# Altium schematic symbol library Capacitor - Ceramic - Sumsung.SchLib: 1421 symbols (part 2 of 8) (continued)
## CL05C100JB51PNC
designator C?, comment 10pF
CAP CER 10PF 50V NP0 0402; Part Number: CL05C100JB51PNC; Manufacturer: Samsung Electro-Mechanics America, Inc.; TemperatureRange: -55C ~ 125C; TemperatureCoefficient: C0G, NP0; Tolerance: 5%; Value: 10pF; PartId: 12579; Supplier 1: Digi-Key; Supplier Part Number 1: 1276-1626-2-ND; ComponentLink1Description: Datasheet; ComponentLink1URL: http://www.samsungsem.com/kr/support/library/product-catalog/__icsFiles/afieldfile/2015/11/18/MLCC.pdf; ComponentLink2Description: Digi-Key Listing; ComponentLink2URL: https://www.digikey.com/product-detail/en/samsung-electro-mechanics-america-inc/CL05C100JB51PNC/1276-1626-2-ND/3887284; Voltage: 50V; Price: 0.0052; Device Package: 0402 (1005 Metric)
footprint CAP 0402/1005
pins: 1, 2

## CL05C101FB5NNNC
designator C?, comment 100pF
CAP CER 100PF 50V NP0 0402; Part Number: CL05C101FB5NNNC; Manufacturer: Samsung Electro-Mechanics America, Inc.; TemperatureRange: -55C ~ 125C; TemperatureCoefficient: C0G, NP0; Tolerance: 1%; Value: 100pF; PartId: 12826; Supplier 1: Digi-Key; Supplier Part Number 1: 1276-1628-2-ND; ComponentLink1Description: Datasheet; ComponentLink1URL: http://www.samsungsem.com/kr/support/library/product-catalog/__icsFiles/afieldfile/2015/11/18/MLCC.pdf; ComponentLink2Description: Digi-Key Listing; ComponentLink2URL: https://www.digikey.com/product-detail/en/samsung-electro-mechanics-america-inc/CL05C101FB5NNNC/1276-1628-2-ND/3887286; Voltage: 50V; Price: 0.0112; Device Package: 0402 (1005 Metric)
footprint CAP 0402/1005
pins: 1, 2

## CL05C101JC51PNC
designator C?, comment 100pF
CAP CER 100PF 100V NP0 0402; Part Number: CL05C101JC51PNC; Manufacturer: Samsung Electro-Mechanics America, Inc.; TemperatureRange: -55C ~ 125C; TemperatureCoefficient: C0G, NP0; Tolerance: 5%; Value: 100pF; PartId: 12798; Supplier 1: Digi-Key; Supplier Part Number 1: 1276-1632-2-ND; ComponentLink1Description: Datasheet; ComponentLink1URL: http://www.samsungsem.com/kr/support/library/product-catalog/__icsFiles/afieldfile/2015/11/18/MLCC.pdf; ComponentLink2Description: Digi-Key Listing; ComponentLink2URL: https://www.digikey.com/product-detail/en/samsung-electro-mechanics-america-inc/CL05C101JC51PNC/1276-1632-2-ND/3887290; Voltage: 100V; Price: 0.0108; Device Package: 0402 (1005 Metric)
footprint CAP 0402/1005
pins: 1, 2

## CL05C102JA5NNNC
designator C?, comment 1000pF
CAP CER 1000PF 25V NP0 0402; Part Number: CL05C102JA5NNNC; Manufacturer: Samsung Electro-Mechanics America, Inc.; TemperatureRange: -55C ~ 125C; TemperatureCoefficient: C0G, NP0; Tolerance: 5%; Value: 1000pF; PartId: 12495; Supplier 1: Digi-Key; Supplier Part Number 1: 1276-1634-2-ND; ComponentLink1Description: Datasheet; ComponentLink1URL: http://www.samsungsem.com/kr/support/product-search/mlcc/CL05C102JA5NNNC.jsp; ComponentLink2Description: Digi-Key Listing; ComponentLink2URL: https://www.digikey.com/product-detail/en/samsung-electro-mechanics-america-inc/CL05C102JA5NNNC/1276-1634-2-ND/3887292; Voltage: 25V; Price: 0.0105; Device Package: 0402 (1005 Metric)
footprint CAP 0402/1005
pins: 1, 2

## CL05C102JO5NNNC
designator C?, comment 1000pF
CAP CER 1000PF 16V NP0 0402; Part Number: CL05C102JO5NNNC; Manufacturer: Samsung Electro-Mechanics America, Inc.; TemperatureRange: -55C ~ 125C; TemperatureCoefficient: C0G, NP0; Tolerance: 5%; Value: 1000pF; PartId: 12920; Supplier 1: Digi-Key; Supplier Part Number 1: 1276-1636-2-ND; ComponentLink1Description: Datasheet; ComponentLink1URL: http://www.samsungsem.com/kr/support/product-search/mlcc/CL05C102JO5NNNC.jsp; ComponentLink2Description: Digi-Key Listing; ComponentLink2URL: https://www.digikey.com/product-detail/en/samsung-electro-mechanics-america-inc/CL05C102JO5NNNC/1276-1636-2-ND/3887294; Voltage: 16V; Price: 0.0105; Device Package: 0402 (1005 Metric)
footprint CAP 0402/1005
pins: 1, 2

## CL05C120JB5NNNC
designator C?, comment 12pF
CAP CER 12PF 50V NP0 0402; Part Number: CL05C120JB5NNNC; Manufacturer: Samsung Electro-Mechanics America, Inc.; TemperatureRange: -55C ~ 125C; TemperatureCoefficient: C0G, NP0; Tolerance: 5%; Value: 12pF; PartId: 12384; Supplier 1: Digi-Key; Supplier Part Number 1: 1276-1178-2-ND; ComponentLink1Description: Datasheet; ComponentLink1URL: http://www.samsungsem.com/kr/support/product-search/mlcc/CL05C120JB5NNNC.jsp; ComponentLink2Description: Digi-Key Listing; ComponentLink2URL: https://www.digikey.com/product-detail/en/samsung-electro-mechanics-america-inc/CL05C120JB5NNNC/1276-1178-2-ND/3886836; Voltage: 50V; Price: 0.0022; Device Package: 0402 (1005 Metric)
footprint CAP 0402/1005
pins: 1, 2

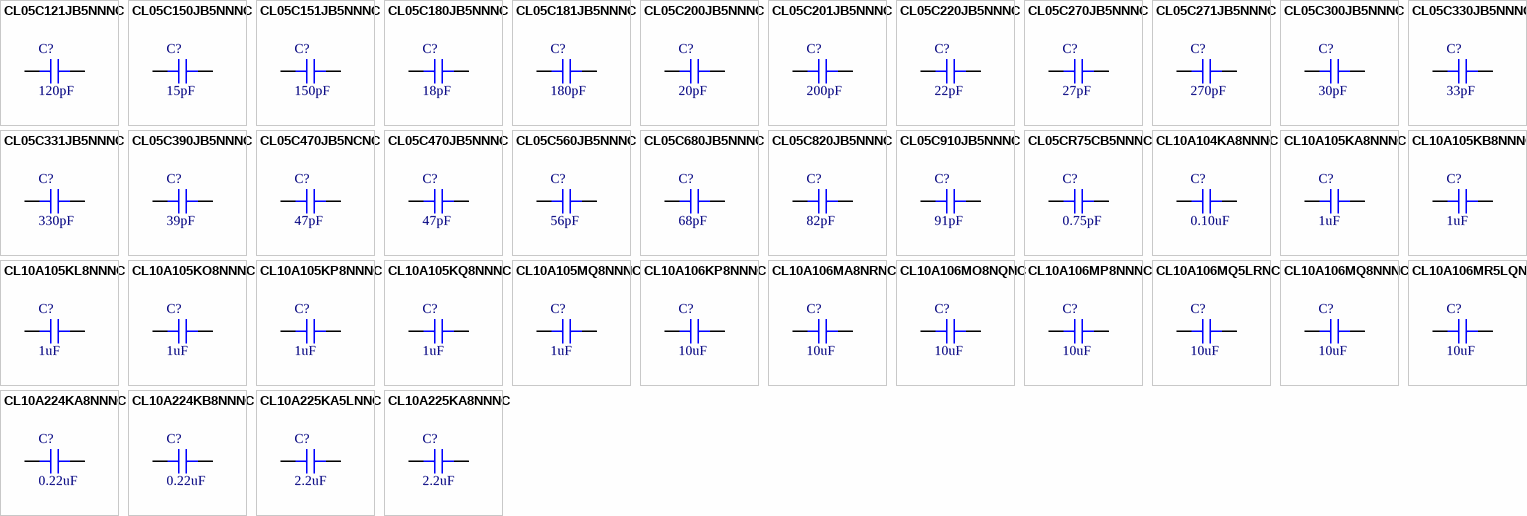
[diagram p6: symbols CL05C121JB5NNNC to CL10A225KA8NNNC]

## CL05C121JB5NNNC
designator C?, comment 120pF
CAP CER 120PF 50V NP0 0402; Part Number: CL05C121JB5NNNC; Manufacturer: Samsung Electro-Mechanics America, Inc.; TemperatureRange: -55C ~ 125C; TemperatureCoefficient: C0G, NP0; Tolerance: 5%; Value: 120pF; PartId: 12568; Supplier 1: Digi-Key; Supplier Part Number 1: 1276-1640-2-ND; ComponentLink1Description: Datasheet; ComponentLink1URL: http://www.samsungsem.com/kr/support/product-search/mlcc/CL05C121JB5NNNC.jsp; ComponentLink2Description: Digi-Key Listing; ComponentLink2URL: https://www.digikey.com/product-detail/en/samsung-electro-mechanics-america-inc/CL05C121JB5NNNC/1276-1640-2-ND/3887298; Voltage: 50V; Price: 0.0035; Device Package: 0402 (1005 Metric)
footprint CAP 0402/1005
pins: 1, 2

## CL05C150JB5NNNC
designator C?, comment 15pF
CAP CER 15PF 50V NP0 0402; Part Number: CL05C150JB5NNNC; Manufacturer: Samsung Electro-Mechanics America, Inc.; TemperatureRange: -55C ~ 125C; TemperatureCoefficient: C0G, NP0; Tolerance: 5%; Value: 15pF; PartId: 12620; Supplier 1: Digi-Key; Supplier Part Number 1: 1276-1179-2-ND; ComponentLink1Description: Datasheet; ComponentLink1URL: http://www.samsungsem.com/kr/support/product-search/mlcc/CL05C150JB5NNNC.jsp; ComponentLink2Description: Digi-Key Listing; ComponentLink2URL: https://www.digikey.com/product-detail/en/samsung-electro-mechanics-america-inc/CL05C150JB5NNNC/1276-1179-2-ND/3886837; Voltage: 50V; Price: 0.0022; Device Package: 0402 (1005 Metric)
footprint CAP 0402/1005
pins: 1, 2

## CL05C151JB5NNNC
designator C?, comment 150pF
CAP CER 150PF 50V NP0 0402; Part Number: CL05C151JB5NNNC; Manufacturer: Samsung Electro-Mechanics America, Inc.; TemperatureRange: -55C ~ 125C; TemperatureCoefficient: C0G, NP0; Tolerance: 5%; Value: 150pF; PartId: 12569; Supplier 1: Digi-Key; Supplier Part Number 1: 1276-1046-2-ND; ComponentLink1Description: Datasheet; ComponentLink1URL: http://www.samsungsem.com/kr/support/product-search/mlcc/CL05C151JB5NNNC.jsp; ComponentLink2Description: Digi-Key Listing; ComponentLink2URL: https://www.digikey.com/product-detail/en/samsung-electro-mechanics-america-inc/CL05C151JB5NNNC/1276-1046-2-ND/3886704; Voltage: 50V; Price: 0.0035; Device Package: 0402 (1005 Metric)
footprint CAP 0402/1005
pins: 1, 2

## CL05C180JB5NNNC
designator C?, comment 18pF
CAP CER 18PF 50V NP0 0402; Part Number: CL05C180JB5NNNC; Manufacturer: Samsung Electro-Mechanics America, Inc.; TemperatureRange: -55C ~ 125C; TemperatureCoefficient: C0G, NP0; Tolerance: 5%; Value: 18pF; PartId: 12459; Supplier 1: Digi-Key; Supplier Part Number 1: 1276-1140-2-ND; ComponentLink1Description: Datasheet; ComponentLink1URL: http://www.samsungsem.com/kr/support/product-search/mlcc/CL05C180JB5NNNC.jsp; ComponentLink2Description: Digi-Key Listing; ComponentLink2URL: https://www.digikey.com/product-detail/en/samsung-electro-mechanics-america-inc/CL05C180JB5NNNC/1276-1140-2-ND/3886798; Voltage: 50V; Price: 0.0022; Device Package: 0402 (1005 Metric)
footprint CAP 0402/1005
pins: 1, 2

## CL05C181JB5NNNC
designator C?, comment 180pF
CAP CER 180PF 50V NP0 0402; Part Number: CL05C181JB5NNNC; Manufacturer: Samsung Electro-Mechanics America, Inc.; TemperatureRange: -55C ~ 125C; TemperatureCoefficient: C0G, NP0; Tolerance: 5%; Value: 180pF; PartId: 12938; Supplier 1: Digi-Key; Supplier Part Number 1: 1276-1651-2-ND; ComponentLink1Description: Datasheet; ComponentLink1URL: http://www.samsungsem.com/kr/support/product-search/mlcc/CL05C181JB5NNNC.jsp; ComponentLink2Description: Digi-Key Listing; ComponentLink2URL: https://www.digikey.com/product-detail/en/samsung-electro-mechanics-america-inc/CL05C181JB5NNNC/1276-1651-2-ND/3887309; Voltage: 50V; Price: 0.0055; Device Package: 0402 (1005 Metric)
footprint CAP 0402/1005
pins: 1, 2

## CL05C200JB5NNNC
designator C?, comment 20pF
CAP CER 20PF 50V NP0 0402; Part Number: CL05C200JB5NNNC; Manufacturer: Samsung Electro-Mechanics America, Inc.; TemperatureRange: -55C ~ 125C; TemperatureCoefficient: C0G, NP0; Tolerance: 5%; Value: 20pF; PartId: 12503; Supplier 1: Digi-Key; Supplier Part Number 1: 1276-1661-2-ND; ComponentLink1Description: Datasheet; ComponentLink1URL: http://www.samsungsem.com/kr/support/product-search/mlcc/CL05C200JB5NNNC.jsp; ComponentLink2Description: Digi-Key Listing; ComponentLink2URL: https://www.digikey.com/product-detail/en/samsung-electro-mechanics-america-inc/CL05C200JB5NNNC/1276-1661-2-ND/3887319; Voltage: 50V; Price: 0.0023; Device Package: 0402 (1005 Metric)
footprint CAP 0402/1005
pins: 1, 2

## CL05C201JB5NNNC
designator C?, comment 200pF
CAP CER 200PF 50V NP0 0402; Part Number: CL05C201JB5NNNC; Manufacturer: Samsung Electro-Mechanics America, Inc.; TemperatureRange: -55C ~ 125C; TemperatureCoefficient: C0G, NP0; Tolerance: 5%; Value: 200pF; PartId: 12927; Supplier 1: Digi-Key; Supplier Part Number 1: 1276-1662-2-ND; ComponentLink1Description: Datasheet; ComponentLink1URL: http://www.samsungsem.com/kr/support/product-search/mlcc/CL05C201JB5NNNC.jsp; ComponentLink2Description: Digi-Key Listing; ComponentLink2URL: https://www.digikey.com/product-detail/en/samsung-electro-mechanics-america-inc/CL05C201JB5NNNC/1276-1662-2-ND/3887320; Voltage: 50V; Price: 0.0089; Device Package: 0402 (1005 Metric)
footprint CAP 0402/1005
pins: 1, 2

## CL05C220JB5NNNC
designator C?, comment 22pF
CAP CER 22PF 50V NP0 0402; Part Number: CL05C220JB5NNNC; Manufacturer: Samsung Electro-Mechanics America, Inc.; TemperatureRange: -55C ~ 125C; TemperatureCoefficient: C0G, NP0; Tolerance: 5%; Value: 22pF; PartId: 12434; Supplier 1: Digi-Key; Supplier Part Number 1: 1276-1116-2-ND; ComponentLink1Description: Datasheet; ComponentLink1URL: http://www.samsungsem.com/kr/support/product-search/mlcc/CL05C220JB5NNNC.jsp; ComponentLink2Description: Digi-Key Listing; ComponentLink2URL: https://www.digikey.com/product-detail/en/samsung-electro-mechanics-america-inc/CL05C220JB5NNNC/1276-1116-2-ND/3886774; Voltage: 50V; Price: 0.0021; Device Package: 0402 (1005 Metric)
footprint CAP 0402/1005
pins: 1, 2

## CL05C270JB5NNNC
designator C?, comment 27pF
CAP CER 27PF 50V NP0 0402; Part Number: CL05C270JB5NNNC; Manufacturer: Samsung Electro-Mechanics America, Inc.; TemperatureRange: -55C ~ 125C; TemperatureCoefficient: C0G, NP0; Tolerance: 5%; Value: 27pF; PartId: 12450; Supplier 1: Digi-Key; Supplier Part Number 1: 1276-1153-2-ND; ComponentLink1Description: Datasheet; ComponentLink1URL: http://www.samsungsem.com/kr/support/product-search/mlcc/CL05C270JB5NNNC.jsp; ComponentLink2Description: Digi-Key Listing; ComponentLink2URL: https://www.digikey.com/product-detail/en/samsung-electro-mechanics-america-inc/CL05C270JB5NNNC/1276-1153-2-ND/3886811; Voltage: 50V; Price: 0.0022; Device Package: 0402 (1005 Metric)
footprint CAP 0402/1005
pins: 1, 2

## CL05C271JB5NNNC
designator C?, comment 270pF
CAP CER 270PF 50V NP0 0402; Part Number: CL05C271JB5NNNC; Manufacturer: Samsung Electro-Mechanics America, Inc.; TemperatureRange: -55C ~ 125C; TemperatureCoefficient: C0G, NP0; Tolerance: 5%; Value: 270pF; PartId: 12715; Supplier 1: Digi-Key; Supplier Part Number 1: 1276-1673-2-ND; ComponentLink1Description: Datasheet; ComponentLink1URL: http://www.samsungsem.com/kr/support/product-search/mlcc/CL05C271JB5NNNC.jsp; ComponentLink2Description: Digi-Key Listing; ComponentLink2URL: https://www.digikey.com/product-detail/en/samsung-electro-mechanics-america-inc/CL05C271JB5NNNC/1276-1673-2-ND/3887331; Voltage: 50V; Price: 0.0041; Device Package: 0402 (1005 Metric)
footprint CAP 0402/1005
pins: 1, 2

## CL05C300JB5NNNC
designator C?, comment 30pF
CAP CER 30PF 50V NP0 0402; Part Number: CL05C300JB5NNNC; Manufacturer: Samsung Electro-Mechanics America, Inc.; TemperatureRange: -55C ~ 125C; TemperatureCoefficient: C0G, NP0; Tolerance: 5%; Value: 30pF; PartId: 12840; Supplier 1: Digi-Key; Supplier Part Number 1: 1276-1682-2-ND; ComponentLink1Description: Datasheet; ComponentLink1URL: http://www.samsungsem.com/kr/support/product-search/mlcc/CL05C300JB5NNNC.jsp; ComponentLink2Description: Digi-Key Listing; ComponentLink2URL: https://www.digikey.com/product-detail/en/samsung-electro-mechanics-america-inc/CL05C300JB5NNNC/1276-1682-2-ND/3887340; Voltage: 50V; Price: 0.0044; Device Package: 0402 (1005 Metric)
footprint CAP 0402/1005
pins: 1, 2

## CL05C330JB5NNNC
designator C?, comment 33pF
CAP CER 33PF 50V NP0 0402; Part Number: CL05C330JB5NNNC; Manufacturer: Samsung Electro-Mechanics America, Inc.; TemperatureRange: -55C ~ 125C; TemperatureCoefficient: C0G, NP0; Tolerance: 5%; Value: 33pF; PartId: 12383; Supplier 1: Digi-Key; Supplier Part Number 1: 1276-1272-2-ND; ComponentLink1Description: Datasheet; ComponentLink1URL: http://www.samsungsem.com/kr/support/product-search/mlcc/CL05C330JB5NNNC.jsp; ComponentLink2Description: Digi-Key Listing; ComponentLink2URL: https://www.digikey.com/product-detail/en/samsung-electro-mechanics-america-inc/CL05C330JB5NNNC/1276-1272-2-ND/3886930; Voltage: 50V; Price: 0.0022; Device Package: 0402 (1005 Metric)
footprint CAP 0402/1005
pins: 1, 2

## CL05C331JB5NNNC
designator C?, comment 330pF
CAP CER 330PF 50V NP0 0402; Part Number: CL05C331JB5NNNC; Manufacturer: Samsung Electro-Mechanics America, Inc.; TemperatureRange: -55C ~ 125C; TemperatureCoefficient: C0G, NP0; Tolerance: 5%; Value: 330pF; PartId: 12674; Supplier 1: Digi-Key; Supplier Part Number 1: 1276-1685-2-ND; ComponentLink1Description: Datasheet; ComponentLink1URL: http://www.samsungsem.com/kr/support/product-search/mlcc/CL05C331JB5NNNC.jsp; ComponentLink2Description: Digi-Key Listing; ComponentLink2URL: https://www.digikey.com/product-detail/en/samsung-electro-mechanics-america-inc/CL05C331JB5NNNC/1276-1685-2-ND/3887343; Voltage: 50V; Price: 0.0054; Device Package: 0402 (1005 Metric)
footprint CAP 0402/1005
pins: 1, 2

## CL05C390JB5NNNC
designator C?, comment 39pF
CAP CER 39PF 50V NP0 0402; Part Number: CL05C390JB5NNNC; Manufacturer: Samsung Electro-Mechanics America, Inc.; TemperatureRange: -55C ~ 125C; TemperatureCoefficient: C0G, NP0; Tolerance: 5%; Value: 39pF; PartId: 12429; Supplier 1: Digi-Key; Supplier Part Number 1: 1276-1016-2-ND; ComponentLink1Description: Datasheet; ComponentLink1URL: http://www.samsungsem.com/kr/support/product-search/mlcc/CL05C390JB5NNNC.jsp; ComponentLink2Description: Digi-Key Listing; ComponentLink2URL: https://www.digikey.com/product-detail/en/samsung-electro-mechanics-america-inc/CL05C390JB5NNNC/1276-1016-2-ND/3886674; Voltage: 50V; Price: 0.0023; Device Package: 0402 (1005 Metric)
footprint CAP 0402/1005
pins: 1, 2

## CL05C470JB5NCNC
designator C?, comment 47pF
CAP CER 47PF 50V NP0 0402; Part Number: CL05C470JB5NCNC; Manufacturer: Samsung Electro-Mechanics America, Inc.; TemperatureRange: -55C ~ 125C; TemperatureCoefficient: C0G, NP0; Tolerance: 5%; Value: 47pF; PartId: 12785; Supplier 1: Digi-Key; Supplier Part Number 1: 1276-1698-2-ND; ComponentLink1Description: Datasheet; ComponentLink1URL: http://www.samsungsem.com/kr/support/library/product-catalog/__icsFiles/afieldfile/2015/11/18/MLCC.pdf; ComponentLink2Description: Digi-Key Listing; ComponentLink2URL: https://www.digikey.com/product-detail/en/samsung-electro-mechanics-america-inc/CL05C470JB5NCNC/1276-1698-2-ND/3887356; Voltage: 50V; Price: 0.0026; Device Package: 0402 (1005 Metric)
footprint CAP 0402/1005
pins: 1, 2

## CL05C470JB5NNNC
designator C?, comment 47pF
CAP CER 47PF 50V NP0 0402; Part Number: CL05C470JB5NNNC; Manufacturer: Samsung Electro-Mechanics America, Inc.; TemperatureRange: -55C ~ 125C; TemperatureCoefficient: C0G, NP0; Tolerance: 5%; Value: 47pF; PartId: 12603; Supplier 1: Digi-Key; Supplier Part Number 1: 1276-1699-2-ND; ComponentLink1Description: Datasheet; ComponentLink1URL: http://www.samsungsem.com/kr/support/product-search/mlcc/CL05C470JB5NNNC.jsp; ComponentLink2Description: Digi-Key Listing; ComponentLink2URL: https://www.digikey.com/product-detail/en/samsung-electro-mechanics-america-inc/CL05C470JB5NNNC/1276-1699-2-ND/3887357; Voltage: 50V; Price: 0.0021; Device Package: 0402 (1005 Metric)
footprint CAP 0402/1005
pins: 1, 2

## CL05C560JB5NNNC
designator C?, comment 56pF
CAP CER 56PF 50V NP0 0402; Part Number: CL05C560JB5NNNC; Manufacturer: Samsung Electro-Mechanics America, Inc.; TemperatureRange: -55C ~ 125C; TemperatureCoefficient: C0G, NP0; Tolerance: 5%; Value: 56pF; PartId: 12724; Supplier 1: Digi-Key; Supplier Part Number 1: 1276-1707-2-ND; ComponentLink1Description: Datasheet; ComponentLink1URL: http://www.samsungsem.com/kr/support/product-search/mlcc/CL05C560JB5NNNC.jsp; ComponentLink2Description: Digi-Key Listing; ComponentLink2URL: https://www.digikey.com/product-detail/en/samsung-electro-mechanics-america-inc/CL05C560JB5NNNC/1276-1707-2-ND/3887365; Voltage: 50V; Price: 0.0022; Device Package: 0402 (1005 Metric)
footprint CAP 0402/1005
pins: 1, 2

## CL05C680JB5NNNC
designator C?, comment 68pF
CAP CER 68PF 50V NP0 0402; Part Number: CL05C680JB5NNNC; Manufacturer: Samsung Electro-Mechanics America, Inc.; TemperatureRange: -55C ~ 125C; TemperatureCoefficient: C0G, NP0; Tolerance: 5%; Value: 68pF; PartId: 12786; Supplier 1: Digi-Key; Supplier Part Number 1: 1276-1030-2-ND; ComponentLink1Description: Datasheet; ComponentLink1URL: http://www.samsungsem.com/kr/support/product-search/mlcc/CL05C680JB5NNNC.jsp; ComponentLink2Description: Digi-Key Listing; ComponentLink2URL: https://www.digikey.com/product-detail/en/samsung-electro-mechanics-america-inc/CL05C680JB5NNNC/1276-1030-2-ND/3886688; Voltage: 50V; Price: 0.0023; Device Package: 0402 (1005 Metric)
footprint CAP 0402/1005
pins: 1, 2

## CL05C820JB5NNNC
designator C?, comment 82pF
CAP CER 82PF 50V NP0 0402; Part Number: CL05C820JB5NNNC; Manufacturer: Samsung Electro-Mechanics America, Inc.; TemperatureRange: -55C ~ 125C; TemperatureCoefficient: C0G, NP0; Tolerance: 5%; Value: 82pF; PartId: 12571; Supplier 1: Digi-Key; Supplier Part Number 1: 1276-1726-2-ND; ComponentLink1Description: Datasheet; ComponentLink1URL: http://www.samsungsem.com/kr/support/product-search/mlcc/CL05C820JB5NNNC.jsp; ComponentLink2Description: Digi-Key Listing; ComponentLink2URL: https://www.digikey.com/product-detail/en/samsung-electro-mechanics-america-inc/CL05C820JB5NNNC/1276-1726-2-ND/3887384; Voltage: 50V; Price: 0.0023; Device Package: 0402 (1005 Metric)
footprint CAP 0402/1005
pins: 1, 2

## CL05C910JB5NNNC
designator C?, comment 91pF
CAP CER 91PF 50V NP0 0402; Part Number: CL05C910JB5NNNC; Manufacturer: Samsung Electro-Mechanics America, Inc.; TemperatureRange: -55C ~ 125C; TemperatureCoefficient: C0G, NP0; Tolerance: 5%; Value: 91pF; PartId: 12936; Supplier 1: Digi-Key; Supplier Part Number 1: 1276-1732-2-ND; ComponentLink1Description: Datasheet; ComponentLink1URL: http://www.samsungsem.com/kr/support/product-search/mlcc/CL05C910JB5NNNC.jsp; ComponentLink2Description: Digi-Key Listing; ComponentLink2URL: https://www.digikey.com/product-detail/en/samsung-electro-mechanics-america-inc/CL05C910JB5NNNC/1276-1732-2-ND/3887390; Voltage: 50V; Price: 0.0056; Device Package: 0402 (1005 Metric)
footprint CAP 0402/1005
pins: 1, 2

## CL05CR75CB5NNNC
designator C?, comment 0.75pF
CAP CER 0.75PF 50V NP0 0402; Part Number: CL05CR75CB5NNNC; Manufacturer: Samsung Electro-Mechanics America, Inc.; TemperatureRange: -55C ~ 125C; TemperatureCoefficient: C0G, NP0; Tolerance: 0.25pF; Value: 0.75pF; PartId: 12794; Supplier 1: Digi-Key; Supplier Part Number 1: 1276-1736-2-ND; ComponentLink1Description: Datasheet; ComponentLink1URL: http://www.samsungsem.com/kr/support/product-search/mlcc/CL05CR75CB5NNNC.jsp; ComponentLink2Description: Digi-Key Listing; ComponentLink2URL: https://www.digikey.com/product-detail/en/samsung-electro-mechanics-america-inc/CL05CR75CB5NNNC/1276-1736-2-ND/3887394; Voltage: 50V; Price: 0.0046; Device Package: 0402 (1005 Metric)
footprint CAP 0402/1005
pins: 1, 2

## CL10A104KA8NNNC
designator C?, comment 0.10uF
CAP CER 0.1UF 25V X5R 0603; Part Number: CL10A104KA8NNNC; Manufacturer: Samsung Electro-Mechanics America, Inc.; TemperatureRange: -55C ~ 85C; Tolerance: 10%; Value: 0.10uF; PartId: 13476; Supplier 1: Digi-Key; Supplier Part Number 1: 1276-1857-2-ND; ComponentLink1Description: Datasheet; ComponentLink1URL: http://www.samsungsem.com/kr/support/product-search/mlcc/CL10A104KA8NNNC.jsp; ComponentLink2Description: Digi-Key Listing; ComponentLink2URL: https://www.digikey.com/product-detail/en/samsung-electro-mechanics-america-inc/CL10A104KA8NNNC/1276-1857-2-ND/3887515; TemperatureCoefficient: X5R; Voltage: 25V; Price: 0.0069; Device Package: 0603 (1608 Metric)
footprint CAP 0603/1608
pins: 1, 2

## CL10A105KA8NNNC
designator C?, comment 1uF
CAP CER 1UF 25V X5R 0603; Part Number: CL10A105KA8NNNC; Manufacturer: Samsung Electro-Mechanics America, Inc.; TemperatureRange: -55C ~ 85C; Tolerance: 10%; Value: 1uF; PartId: 13209; Supplier 1: Digi-Key; Supplier Part Number 1: 1276-1102-2-ND; ComponentLink1Description: Datasheet; ComponentLink1URL: http://www.samsungsem.com/kr/support/product-search/mlcc/CL10A105KA8NNNC.jsp; ComponentLink2Description: Digi-Key Listing; ComponentLink2URL: https://www.digikey.com/product-detail/en/samsung-electro-mechanics-america-inc/CL10A105KA8NNNC/1276-1102-2-ND/3886760; TemperatureCoefficient: X5R; Voltage: 25V; Price: 0.0082; Device Package: 0603 (1608 Metric)
footprint CAP 0603/1608
pins: 1, 2

## CL10A105KB8NNNC
designator C?, comment 1uF
CAP CER 1UF 50V X5R 0603; Part Number: CL10A105KB8NNNC; Manufacturer: Samsung Electro-Mechanics America, Inc.; TemperatureRange: -55C ~ 85C; Tolerance: 10%; Value: 1uF; PartId: 13187; Supplier 1: Digi-Key; Supplier Part Number 1: 1276-1860-2-ND; ComponentLink1Description: Datasheet; ComponentLink1URL: http://www.samsungsem.com/kr/support/product-search/mlcc/CL10A105KB8NNNC.jsp; ComponentLink2Description: Digi-Key Listing; ComponentLink2URL: https://www.digikey.com/product-detail/en/samsung-electro-mechanics-america-inc/CL10A105KB8NNNC/1276-1860-2-ND/3887518; TemperatureCoefficient: X5R; Voltage: 50V; Price: 0.0236; Device Package: 0603 (1608 Metric)
footprint CAP 0603/1608
pins: 1, 2

## CL10A105KL8NNNC
designator C?, comment 1uF
CAP CER 1UF 35V X5R 0603; Part Number: CL10A105KL8NNNC; Manufacturer: Samsung Electro-Mechanics America, Inc.; TemperatureRange: -55C ~ 85C; Tolerance: 10%; Value: 1uF; PartId: 13292; Supplier 1: Digi-Key; Supplier Part Number 1: 1276-1861-2-ND; ComponentLink1Description: Datasheet; ComponentLink1URL: http://www.samsungsem.com/kr/support/product-search/mlcc/CL10A105KL8NNNC.jsp; ComponentLink2Description: Digi-Key Listing; ComponentLink2URL: https://www.digikey.com/product-detail/en/samsung-electro-mechanics-america-inc/CL10A105KL8NNNC/1276-1861-2-ND/3887519; TemperatureCoefficient: X5R; Voltage: 35V; Price: 0.0236; Device Package: 0603 (1608 Metric)
footprint CAP 0603/1608
pins: 1, 2

## CL10A105KO8NNNC
designator C?, comment 1uF
CAP CER 1UF 16V X5R 0603; Part Number: CL10A105KO8NNNC; Manufacturer: Samsung Electro-Mechanics America, Inc.; TemperatureRange: -55C ~ 85C; Tolerance: 10%; Value: 1uF; PartId: 13125; Supplier 1: Digi-Key; Supplier Part Number 1: 1276-1034-2-ND; ComponentLink1Description: Datasheet; ComponentLink1URL: http://www.samsungsem.com/kr/support/product-search/mlcc/CL10A105KO8NNNC.jsp; ComponentLink2Description: Digi-Key Listing; ComponentLink2URL: https://www.digikey.com/product-detail/en/samsung-electro-mechanics-america-inc/CL10A105KO8NNNC/1276-1034-2-ND/3886692; TemperatureCoefficient: X5R; Voltage: 16V; Price: 0.0072; Device Package: 0603 (1608 Metric)
footprint CAP 0603/1608
pins: 1, 2

## CL10A105KP8NNNC
designator C?, comment 1uF
CAP CER 1UF 10V X5R 0603; Part Number: CL10A105KP8NNNC; Manufacturer: Samsung Electro-Mechanics America, Inc.; TemperatureRange: -55C ~ 85C; Tolerance: 10%; Value: 1uF; PartId: 13628; Supplier 1: Digi-Key; Supplier Part Number 1: 1276-1182-2-ND; ComponentLink1Description: Datasheet; ComponentLink1URL: http://www.samsungsem.com/kr/support/product-search/mlcc/CL10A105KP8NNNC.jsp; ComponentLink2Description: Digi-Key Listing; ComponentLink2URL: https://www.digikey.com/product-detail/en/samsung-electro-mechanics-america-inc/CL10A105KP8NNNC/1276-1182-2-ND/3886840; TemperatureCoefficient: X5R; Voltage: 10V; Price: 0.0058; Device Package: 0603 (1608 Metric)
footprint CAP 0603/1608
pins: 1, 2

## CL10A105KQ8NNNC
designator C?, comment 1uF
CAP CER 1UF 6.3V X5R 0603; Part Number: CL10A105KQ8NNNC; Manufacturer: Samsung Electro-Mechanics; TemperatureRange: -55C ~ 85C; Tolerance: 10%; Value: 1uF; PartId: 30208; Supplier 1: Digi-Key; Supplier Part Number 1: 1276-1036-2-ND; ComponentLink1Description: Datasheet; ComponentLink1URL: http://www.samsungsem.com/kr/support/product-search/mlcc/CL10A105KQ8NNNC.jsp; ComponentLink2Description: Digi-Key Listing; ComponentLink2URL: https://www.digikey.com/product-detail/en/samsung-electro-mechanics/CL10A105KQ8NNNC/1276-1036-2-ND/3886694; TemperatureCoefficient: X5R; Voltage: 6.3V; Price: 0; Device Package: 0603 (1608 Metric)
footprint CAP 0603/1608
pins: 1, 2

## CL10A105MQ8NNNC
designator C?, comment 1uF
CAP CER 1UF 6.3V X5R 0603; Part Number: CL10A105MQ8NNNC; Manufacturer: Samsung Electro-Mechanics America, Inc.; TemperatureRange: -55C ~ 85C; Tolerance: 20%; Value: 1uF; PartId: 13627; Supplier 1: Digi-Key; Supplier Part Number 1: 1276-1867-2-ND; ComponentLink1Description: Datasheet; ComponentLink1URL: http://www.samsungsem.com/kr/support/product-search/mlcc/CL10A105MQ8NNNC.jsp; ComponentLink2Description: Digi-Key Listing; ComponentLink2URL: https://www.digikey.com/product-detail/en/samsung-electro-mechanics-america-inc/CL10A105MQ8NNNC/1276-1867-2-ND/3887525; TemperatureCoefficient: X5R; Voltage: 6.3V; Price: 0.0058; Device Package: 0603 (1608 Metric)
footprint CAP 0603/1608
pins: 1, 2

## CL10A106KP8NNNC
designator C?, comment 10uF
CAP CER 10UF 10V X5R 0603; Part Number: CL10A106KP8NNNC; Manufacturer: Samsung Electro-Mechanics America, Inc.; TemperatureRange: -55C ~ 85C; Tolerance: 10%; Value: 10uF; PartId: 13182; Supplier 1: Digi-Key; Supplier Part Number 1: 1276-1192-2-ND; ComponentLink1Description: Datasheet; ComponentLink1URL: http://www.samsungsem.com/kr/support/product-search/mlcc/CL10A106KP8NNNC.jsp; ComponentLink2Description: Digi-Key Listing; ComponentLink2URL: https://www.digikey.com/product-detail/en/samsung-electro-mechanics-america-inc/CL10A106KP8NNNC/1276-1192-2-ND/3886850; TemperatureCoefficient: X5R; Voltage: 10V; Price: 0.061; Device Package: 0603 (1608 Metric)
footprint CAP 0603/1608
pins: 1, 2

## CL10A106MA8NRNC
designator C?, comment 10uF
CAP CER 10UF 25V X5R 0603; Part Number: CL10A106MA8NRNC; Manufacturer: Samsung Electro-Mechanics America, Inc.; TemperatureRange: -55C ~ 85C; Tolerance: 20%; Value: 10uF; PartId: 13174; Supplier 1: Digi-Key; Supplier Part Number 1: 1276-1869-2-ND; ComponentLink1Description: Datasheet; ComponentLink1URL: http://www.samsungsem.com/kr/support/product-search/mlcc/CL10A106MA8NRNC.jsp; ComponentLink2Description: Digi-Key Listing; ComponentLink2URL: https://www.digikey.com/product-detail/en/samsung-electro-mechanics-america-inc/CL10A106MA8NRNC/1276-1869-2-ND/3887527; TemperatureCoefficient: X5R; Voltage: 25V; Price: 0.196; Device Package: 0603 (1608 Metric)
footprint CAP 0603/1608
pins: 1, 2

## CL10A106MO8NQNC
designator C?, comment 10uF
CAP CER 10UF 16V X5R 0603; Part Number: CL10A106MO8NQNC; Manufacturer: Samsung Electro-Mechanics America, Inc.; TemperatureRange: -55C ~ 85C; Tolerance: 20%; Value: 10uF; PartId: 13189; Supplier 1: Digi-Key; Supplier Part Number 1: 1276-1870-2-ND; ComponentLink1Description: Datasheet; ComponentLink1URL: http://www.samsungsem.com/kr/support/product-search/mlcc/CL10A106MO8NQNC.jsp; ComponentLink2Description: Digi-Key Listing; ComponentLink2URL: https://www.digikey.com/product-detail/en/samsung-electro-mechanics-america-inc/CL10A106MO8NQNC/1276-1870-2-ND/3887528; TemperatureCoefficient: X5R; Voltage: 16V; Price: 0.3135; Device Package: 0603 (1608 Metric)
footprint CAP 0603/1608
pins: 1, 2

## CL10A106MP8NNNC
designator C?, comment 10uF
CAP CER 10UF 10V X5R 0603; Part Number: CL10A106MP8NNNC; Manufacturer: Samsung Electro-Mechanics America, Inc.; TemperatureRange: -55C ~ 85C; Tolerance: 20%; Value: 10uF; PartId: 13169; Supplier 1: Digi-Key; Supplier Part Number 1: 1276-1871-2-ND; ComponentLink1Description: Datasheet; ComponentLink1URL: http://www.samsungsem.com/kr/support/product-search/mlcc/CL10A106MP8NNNC.jsp; ComponentLink2Description: Digi-Key Listing; ComponentLink2URL: https://www.digikey.com/product-detail/en/samsung-electro-mechanics-america-inc/CL10A106MP8NNNC/1276-1871-2-ND/3887529; TemperatureCoefficient: X5R; Voltage: 10V; Price: 0.0736; Device Package: 0603 (1608 Metric)
footprint CAP 0603/1608
pins: 1, 2

## CL10A106MQ5LRNC
designator C?, comment 10uF
CAP CER 10UF 6.3V X5R 0603; Part Number: CL10A106MQ5LRNC; Manufacturer: Samsung Electro-Mechanics America, Inc.; TemperatureRange: -55C ~ 85C; Tolerance: 20%; Value: 10uF; PartId: 13485; Supplier 1: Digi-Key; Supplier Part Number 1: 1276-1872-2-ND; ComponentLink1Description: Datasheet; ComponentLink1URL: http://www.samsungsem.com/kr/support/product-search/mlcc/CL10A106MQ5LRNC.jsp; ComponentLink2Description: Digi-Key Listing; ComponentLink2URL: https://www.digikey.com/product-detail/en/samsung-electro-mechanics-america-inc/CL10A106MQ5LRNC/1276-1872-2-ND/3887530; TemperatureCoefficient: X5R; Voltage: 6.3V; Price: 0.0571; Device Package: 0603 (1608 Metric)
footprint CAP 0603/1608
pins: 1, 2

## CL10A106MQ8NNNC
designator C?, comment 10uF
CAP CER 10UF 6.3V X5R 0603; Part Number: CL10A106MQ8NNNC; Manufacturer: Samsung Electro-Mechanics America, Inc.; TemperatureRange: -55C ~ 85C; Tolerance: 20%; Value: 10uF; PartId: 13031; Supplier 1: Digi-Key; Supplier Part Number 1: 1276-1119-2-ND; ComponentLink1Description: Datasheet; ComponentLink1URL: http://www.samsungsem.com/kr/support/product-search/mlcc/CL10A106MQ8NNNC.jsp; ComponentLink2Description: Digi-Key Listing; ComponentLink2URL: https://www.digikey.com/product-detail/en/samsung-electro-mechanics-america-inc/CL10A106MQ8NNNC/1276-1119-2-ND/3886777; TemperatureCoefficient: X5R; Voltage: 6.3V; Price: 0.0274; Device Package: 0603 (1608 Metric)
footprint CAP 0603/1608
pins: 1, 2

## CL10A106MR5LQNC
designator C?, comment 10uF
CAP CER 10UF 4V X5R 0603; Part Number: CL10A106MR5LQNC; Manufacturer: Samsung Electro-Mechanics America, Inc.; TemperatureRange: -55C ~ 85C; Tolerance: 20%; Value: 10uF; PartId: 13640; Supplier 1: Digi-Key; Supplier Part Number 1: 1276-1873-2-ND; ComponentLink1Description: Datasheet; ComponentLink1URL: http://www.samsungsem.com/kr/support/product-search/mlcc/CL10A106MR5LQNC.jsp; ComponentLink2Description: Digi-Key Listing; ComponentLink2URL: https://www.digikey.com/product-detail/en/samsung-electro-mechanics-america-inc/CL10A106MR5LQNC/1276-1873-2-ND/3887531; TemperatureCoefficient: X5R; Voltage: 4V; Price: 0.0274; Device Package: 0603 (1608 Metric)
footprint CAP 0603/1608
pins: 1, 2

## CL10A224KA8NNNC
designator C?, comment 0.22uF
CAP CER 0.22UF 25V X5R 0603; Part Number: CL10A224KA8NNNC; Manufacturer: Samsung Electro-Mechanics; TemperatureRange: -55C ~ 85C; Tolerance: 10%; Value: 0.22uF; PartId: 30476; Supplier 1: Digi-Key; Supplier Part Number 1: 1276-1875-2-ND; ComponentLink1Description: Datasheet; ComponentLink1URL: http://www.samsungsem.com/kr/support/product-search/mlcc/CL10A224KA8NNNC.jsp; ComponentLink2Description: Digi-Key Listing; ComponentLink2URL: https://www.digikey.com/product-detail/en/samsung-electro-mechanics/CL10A224KA8NNNC/1276-1875-2-ND/3887533; TemperatureCoefficient: X5R; Voltage: 25V; Price: 0; Device Package: 0603 (1608 Metric)
footprint CAP 0603/1608
pins: 1, 2

## CL10A224KB8NNNC
designator C?, comment 0.22uF
CAP CER 0.22UF 50V X5R 0603; Part Number: CL10A224KB8NNNC; Manufacturer: Samsung Electro-Mechanics; TemperatureRange: -55C ~ 85C; Tolerance: 10%; Value: 0.22uF; PartId: 30823; Supplier 1: Digi-Key; Supplier Part Number 1: 1276-1876-2-ND; ComponentLink1Description: Datasheet; ComponentLink1URL: http://www.samsungsem.com/kr/support/product-search/mlcc/CL10A224KB8NNNC.jsp; ComponentLink2Description: Digi-Key Listing; ComponentLink2URL: https://www.digikey.com/product-detail/en/samsung-electro-mechanics/CL10A224KB8NNNC/1276-1876-2-ND/3887534; TemperatureCoefficient: X5R; Voltage: 50V; Price: 0; Device Package: 0603 (1608 Metric)
footprint CAP 0603/1608
pins: 1, 2

## CL10A225KA5LNNC
designator C?, comment 2.2uF
CAP CER 2.2UF 25V X5R 0603; Part Number: CL10A225KA5LNNC; Manufacturer: Samsung Electro-Mechanics America, Inc.; TemperatureRange: -55C ~ 85C; Tolerance: 10%; Value: 2.2uF; PartId: 13338; Supplier 1: Digi-Key; Supplier Part Number 1: 1276-1878-2-ND; ComponentLink1Description: Datasheet; ComponentLink1URL: http://www.samsungsem.com/kr/front/downloadcms.do?path=/kr/support/product-search/mlcc/__icsFiles/afieldfile/2014/11/05&fileName=C_CL10A225KA5LNNC.pdf; ComponentLink2Description: Digi-Key Listing; ComponentLink2URL: https://www.digikey.com/product-detail/en/samsung-electro-mechanics-america-inc/CL10A225KA5LNNC/1276-1878-2-ND/3887536; TemperatureCoefficient: X5R; Voltage: 25V; Price: 0.036; Device Package: 0603 (1608 Metric)
footprint CAP 0603/1608
pins: 1, 2

## CL10A225KA8NNNC
designator C?, comment 2.2uF
CAP CER 2.2UF 25V X5R 0603; Part Number: CL10A225KA8NNNC; Manufacturer: Samsung Electro-Mechanics America, Inc.; TemperatureRange: -55C ~ 85C; Tolerance: 10%; Value: 2.2uF; PartId: 13360; Supplier 1: Digi-Key; Supplier Part Number 1: 1276-1879-2-ND; ComponentLink1Description: Datasheet; ComponentLink1URL: http://www.samsungsem.com/kr/support/product-search/mlcc/CL10A225KA8NNNC.jsp; ComponentLink2Description: Digi-Key Listing; ComponentLink2URL: https://www.digikey.com/product-detail/en/samsung-electro-mechanics-america-inc/CL10A225KA8NNNC/1276-1879-2-ND/3887537; TemperatureCoefficient: X5R; Voltage: 25V; Price: 0.0294; Device Package: 0603 (1608 Metric)
footprint CAP 0603/1608
pins: 1, 2
